# Altium footprint library SPECIAL.PcbLib: 68 footprints (part 5 of 5)
Each footprint in its own frame and in the unit in brackets; x right, y up, seen from the top. Pads: shape width x height; smd on the part's side, far side on the other; paste and mask are expansions set on the pad; w line width, h text height; cw(c..) or ccw(c..) is an arc to the next point about the centre after c.
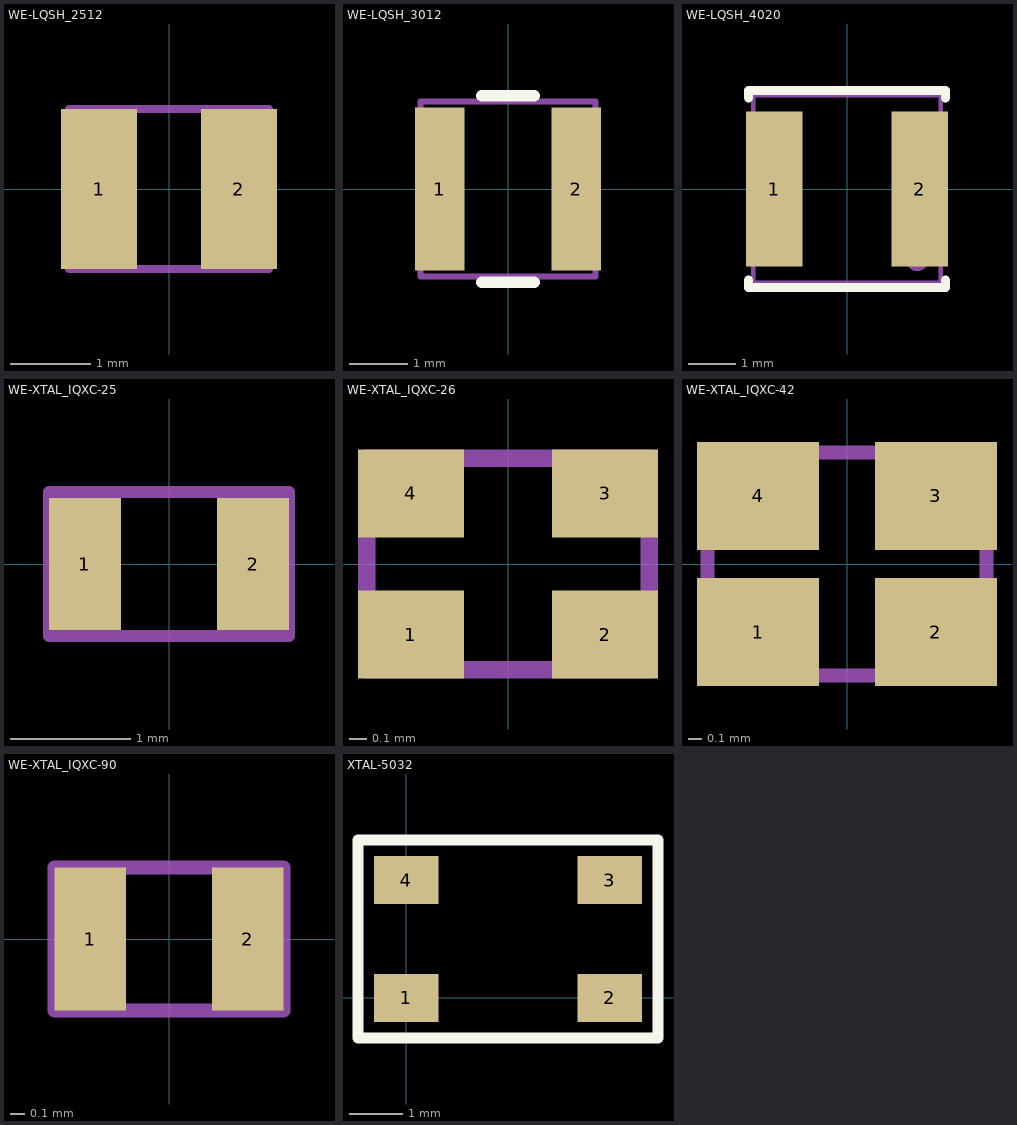
[diagram p4: the footprints below, top view; thin cyan lines are the x and y axes]

## WE-LQSH_2512 [mm] "SMT Semi-Shielded High Saturation Power Inductor, body 2.5x2mm"
height 1.2
pads (2):
  rect 0.95x2 smd: 1(-0.875,0) 2(0.875,0)
Mechanical 13:
  circle w0.2: c-0.85,-0.6 r0.1
  lines w0.1: -1.25,-1 1.25,-1 1.25,1 -1.25,1 -1.25,-1
3D body "IndLQSH_2512.stp": height 1.19, standoff -0.01, extent -1.25,-1 1.25,1

## WE-LQSH_3012 [mm] "SMT Semi-Shielded High Saturation Power Inductor, body 3x3mm"
height 1.2
pads (2):
  rect 0.85x2.8 smd: 1(-1.175,0) 2(1.175,0)
Top Overlay:
  lines w0.2: -0.45,-1.6 0.45,-1.6 ; -0.45,1.6 0.45,1.6
Mechanical 13:
  circle w0.2: c-1,-1 r0.1
  lines w0.1: -1.5,-1.5 -1.5,1.5 1.5,1.5 1.5,-1.5 -1.5,-1.5
3D body "IndLQSH_3012.stp": height 1.2, standoff 0, extent -1.5,-1.543 1.5,1.5

## WE-LQSH_4020 [mm] "SMT Semi-Shielded High Saturation Power Inductor, body 4x4mm"
height 2
pads (2):
  rect 1.2x3.3 smd: 1(-1.55,0) 2(1.55,0)
Top Overlay:
  lines w0.2: -2.1,-1.95 -2.1,-2.1 2.1,-2.1 2.1,-1.95 ; -2.1,1.95 -2.1,2.1 2.1,2.1 2.1,1.95
Mechanical 13:
  circle w0.25: c1.5,-1.5 r0.125
  lines w0.1: -2,-2 2,-2 2,2 -2,2 -2,-2
3D body "IndLQSH_4020.stp": height 2.01, standoff 0.02, extent -2,-2.02 2,2

## WE-XTAL_IQXC-25 [mm] "Quartz Crystal, size IQXC-25, body 2x1mm"
height 0.6
pads (2):
  rect 0.6x1.1 smd: 1(-0.7,0) 2(0.7,0)
Mechanical 13:
  lines w0.1: -1,-0.6 1,-0.6 1,0.6 -1,0.6 -1,-0.6
3D body "FrqXTAL_IQXC-25.stp": height 0.55, standoff 0, extent -1,-0.6 1,0.6

## WE-XTAL_IQXC-26 [mm] "Quartz Crystal, size IQXC-26, body 1.6x1.2mm"
height 0.4
pads (4):
  rect 0.6x0.5 smd: 1(-0.55,-0.4) 2(0.55,-0.4) 3(0.55,0.4) 4(-0.55,0.4)
Mechanical 13:
  lines w0.1: -0.8,-0.6 -0.8,0.6 0.8,0.6 0.8,-0.6 -0.8,-0.6
3D body "FrqXTAL_IQXC-26.stp": height 0.4, standoff 0, extent -0.8,-0.6 0.8,0.6

## WE-XTAL_IQXC-42 [mm] "Quartz Crystal, size IQXC-42, body 2x1.6mm"
height 0.5
pads (4):
  rect 0.875x0.775 smd: 1(-0.637,-0.487) 2(0.637,-0.487) 3(0.637,0.487) 4(-0.637,0.487)
Mechanical 13:
  lines w0.1: -1,-0.8 -1,0.8 1,0.8 1,-0.8 -1,-0.8
3D body "FrqXTAL_IQXC-42.stp": height 0.5, standoff 0, extent -1,-0.8 1,0.8

## WE-XTAL_IQXC-90 [mm] "Quartz Crystal, size IQXC-90, body 1.6x1mm"
height 0.5
pads (2):
  rect 0.5x1 smd: 1(-0.55,0) 2(0.55,0)
Mechanical 13:
  lines w0.1: -0.8,-0.5 -0.8,0.5 0.8,0.5 0.8,-0.5 -0.8,-0.5
3D body "FrqXTAL_IQXC-90.stp": height 0.5, standoff 0, extent -0.8,-0.5 0.8,0.5

## XTAL-5032 [mm]
pads (4):
  rect 1.2x0.9 smd mask-0.2: 1(0,0) 2(3.8,0) 3(3.8,2.2) 4(0,2.2)
Top Overlay:
  lines w0.2: -0.9,-0.75 -0.9,2.95 4.7,2.95 4.7,-0.75 -0.9,-0.75